# Altium footprint library Mi Libreria.PcbLib: 184 footprints (part 1 of 12)
Each footprint in its own frame and in the unit in brackets; x right, y up, seen from the top. Pads: shape width x height; smd on the part's side, far side on the other; paste and mask are expansions set on the pad; w line width, h text height; cw(c..) or ccw(c..) is an arc to the next point about the centre after c.
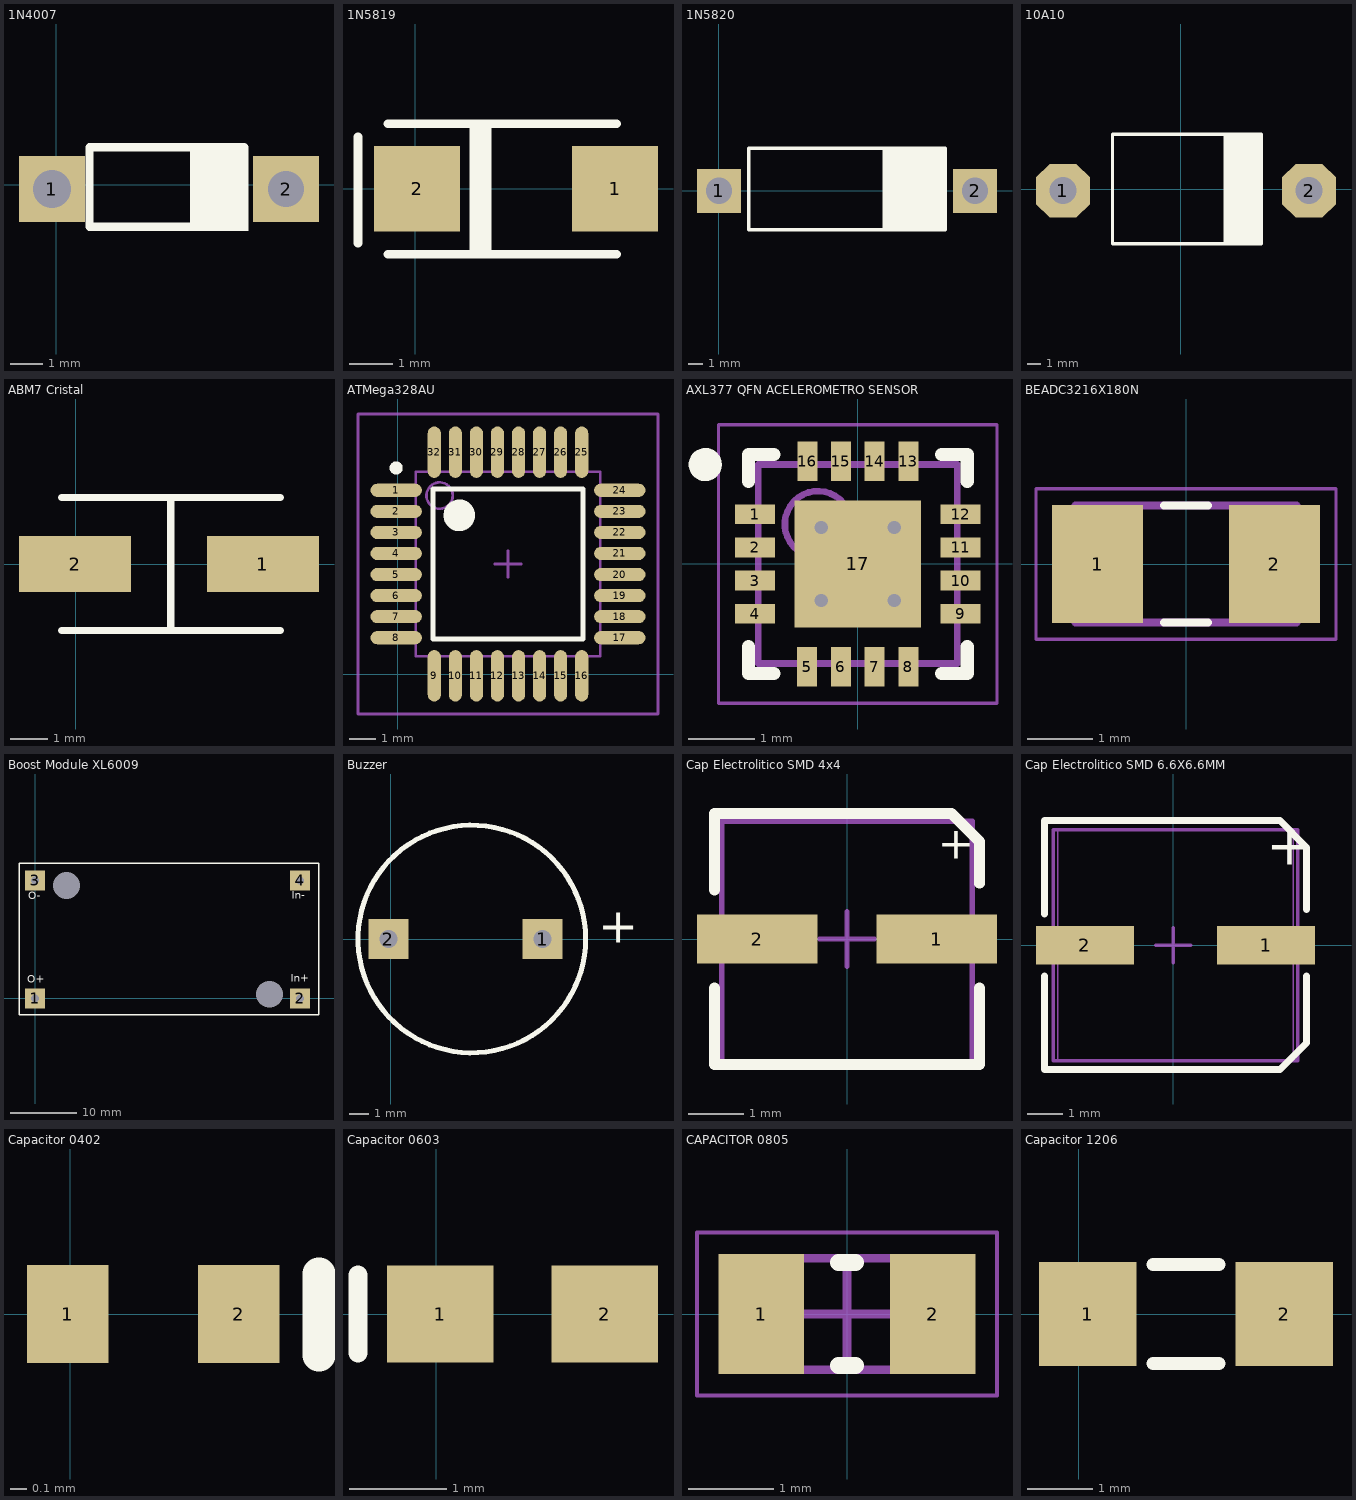
[diagram p0: the footprints below, top view; thin cyan lines are the x and y axes]

## 1N4007 [mm] "Diode Rectifier TH"
pads (2):
  rect 2x2 hole 1.15: 1(-0.127,-0.127)
  rect 2x2 hole 1.1: 2(6.985,-0.127)
Top Overlay:
  rectangle: 4.064,-1.397 5.842,1.143
  lines w0.254: 5.715,-1.27 1.016,-1.27 1.016,1.143 5.715,1.143
3D body "1N4007 x7mm.step": height 3.31, standoff -1.9, extent -0.471,-1.437 7.329,1.183

## 1N5819 [mm] "DO-214"
pads (2):
  rect 2x2 smd: 1(4.655,0) 2(0.044,0)
Top Overlay:
  region: 1.775,1.517 1.267,1.517 1.267,-1.531 1.775,-1.531
  lines w0.2: -1.333,-1.27 -1.333,1.206 ; -0.638,-1.531 4.696,-1.531 ; -0.638,1.517 4.696,1.517
3D body "User Library-DO-214AC_SMA.STEP": height 2.15, standoff -0.05, extent -0.238,-1.35 4.762,1.35

## 1N5820 [mm] "Diodo Shottky 3A Trough Hole"
pads (2):
  rect 3x3 hole 1.8: 1(0,0) 2(17.526,0)
Top Overlay:
  rectangle: 11.176,-2.667 15.494,2.921
  lines w0.254: 15.494,-1.524 15.494,2.921 2.032,2.921 2.032,-2.667 15.494,-2.667 15.494,1.651
3D body "1N5820.step": height 5.51, standoff -3.1, extent -0.727,-2.413 18.253,2.607

## 10A10 [mm] "DIODE"
pads (2):
  oct 4x4 hole 2: 1(-8.763,-0.127) 2(9.525,-0.127)
Top Overlay:
  rectangle: 3.175,-4.064 5.969,4.064
  lines w0.254: 5.969,-1.651 5.969,4.064 -5.08,4.064 -5.08,-4.064 5.969,-4.064 5.969,1.524
3D body "10A10.step": height 9.1, standoff -2, extent -9.54,-4.4 10.64,4.4

## ABM7 Cristal [mm]
pads (2):
  rect 3x1.5 smd: 1(5,0) 2(-0.02,0)
Top Overlay:
  lines w0.2: -0.381,-1.778 5.461,-1.778 ; -0.381,1.778 5.461,1.778 ; 2.54,-1.778 2.54,1.778
3D body "ABM7.step": height 1.44, standoff 0, extent -0.51,-1.75 5.59,1.75

## ATMega328AU [mm] "TQFP 32"
pads (32):
  oval 1.95x0.5 smd: 1(-0.059,6.991) 2(-0.059,6.191) 3(-0.059,5.391) 4(-0.059,4.591) 5(-0.059,3.791) 6(-0.059,2.991) 7(-0.059,2.191) 8(-0.059,1.391) 17(8.441,1.391) 18(8.441,2.191) 19(8.441,2.991) 20(8.441,3.791) 21(8.441,4.591) 22(8.441,5.391) 23(8.441,6.191) 24(8.441,6.991)
  oval 0.5x1.95 smd: 9(1.391,-0.059) 10(2.191,-0.059) 11(2.991,-0.059) 12(3.791,-0.059) 13(4.591,-0.059) 14(5.391,-0.059) 15(6.191,-0.059) 16(6.991,-0.059) 25(6.991,8.441) 26(6.191,8.441) 27(5.391,8.441) 28(4.591,8.441) 29(3.791,8.441) 30(2.991,8.441) 31(2.191,8.441) 32(1.391,8.441)
Top Overlay:
  circle w0.25: c-0.059,7.841 r0.125
  circle w0.6: c2.341,6.041 r0.3
  lines w0.2: 1.341,1.341 1.341,7.041 7.041,7.041 7.041,1.341 1.341,1.341
Mechanical 13:
  circle w0.1: c1.591,6.791 r0.5
  lines w0.1: 0.691,0.691 0.691,7.691 7.691,7.691 7.691,0.691 0.691,0.691
Mechanical 15:
  lines w0.1: 3.691,4.191 4.691,4.191 ; 4.191,3.691 4.191,4.691 ; -1.509,-1.509 -1.509,9.891 9.891,9.891 9.891,-1.509 -1.509,-1.509
3D body "atmega8.step": height 1.1, standoff -0.01, extent -0.552,-0.666 9.048,8.934

## AXL377 QFN ACELEROMETRO SENSOR [mm] "QFN, 16-Leads, Body 3.00x3.00mm, Pitch 0.50mm/0.51mm, Thermal Pad 1.91x1.91mm, IPC Medium Density"
height 1
pads (17):
  rect 0.6x0.3 smd: 1(-1.55,0.75) 2(-1.55,0.25) 3(-1.55,-0.25) 4(-1.55,-0.75) 9(1.55,-0.75) 10(1.55,-0.25) 11(1.55,0.25) 12(1.55,0.75)
  rect 0.3x0.6 smd: 5(-0.765,-1.55) 6(-0.255,-1.55) 7(0.255,-1.55) 8(0.765,-1.55) 13(0.765,1.55) 14(0.255,1.55) 15(-0.255,1.55) 16(-0.76,1.55)
  rect 1.91x1.91 smd: 17(0,0)
via -0.55,0.55 diameter 0.5 hole 0.2
via 0.55,0.55 diameter 0.5 hole 0.2
via -0.55,-0.55 diameter 0.5 hole 0.2
via 0.55,-0.55 diameter 0.5 hole 0.2
Top Overlay:
  circle w0.25: c-2.3,1.5 r0.125
  lines w0.2: -1.65,-1.25 -1.65,-1.65 -1.265,-1.65 ; -1.65,1.25 -1.65,1.65 -1.265,1.65 ; 1.265,-1.65 1.65,-1.65 1.65,-1.25 ; 1.265,1.65 1.65,1.65 1.65,1.25
Mechanical 13:
  circle w0.1: c-0.6,0.6 r0.5
  lines w0.1: -1.5,-1.5 -1.5,1.5 1.5,1.5 1.5,-1.5 -1.5,-1.5
Mechanical 15:
  lines w0.05: -2.1,-2.1 -2.1,2.1 2.1,2.1 2.1,-2.1 -2.1,-2.1
  lines w0.1: -0.5,0 0.5,0 ; 0,-0.5 0,0.5
3D body: height 1, standoff 0.01, extent -1.5,-1.5 1.5,1.5

## BEADC3216X180N [mm]
pads (2):
  rect 1.4x1.82 smd: 1(-1.36,0) 2(1.36,0)
Top Overlay:
  lines w0.127: -0.34,-0.9 0.34,-0.9 ; -0.34,0.9 0.34,0.9
Mechanical 13:
  lines w0.127: -1.7,-0.9 1.7,-0.9 1.7,0.9 -1.7,0.9 -1.7,-0.9
Mechanical 15:
  lines w0.05: -2.308,-1.158 2.308,-1.158 2.308,1.158 -2.308,1.158 -2.308,-1.158
3D body "BLM31KN102BH1L.STEP": height 1.6, standoff 0, extent -1.6,-0.911 1.6,0.889

## Boost Module XL6009 [mm] "Boost Converter DC-DC"
pads (6):
  rect 3x3 hole 1.2: 1(0,0) 2(39.6,0) 3(0,17.653) 4(39.6,17.653)
  round 1.524 hole 4: ""(4.699,16.891) ""(35.032,0.635)
Top Overlay:
  lines w0.2: -2.413,-2.413 42.418,-2.413 42.418,20.193 -2.413,20.193 -2.413,-2.413
  text "O+" at -1.143,1.905 h2
  text "O-" at -1.016,14.351 h2
  text "In-" at 38.354,14.478 h2
  text "In+" at 38.227,2.032 h2
3D body "DC-DC XL6009E1 (STEP AP214).STEP": height 14.05, standoff 0.3, extent -1.651,-1.651 41.649,19.449

## Buzzer [mm] "Buzzer 5V"
pads (2):
  rect 2x2 hole 0.9: 1(7.62,0) 2(-0.127,0)
Top Overlay:
  circle w0.254: c4.064,0 r5.715
  text "+" at 10.414,-0.762 h3
3D body "Buzzer.step": height 10.65, standoff -3.5, extent -2.266,-6.096 13.188,5.904

## Cap Electrolitico SMD 4x4 [mm] "SMD Capacitor 4x4mm"
pads (2):
  rect 2.2x0.9 smd: 1(1.634,0) 2(-1.634,0)
Top Overlay:
  lines w0.2: -2.413,-0.889 -2.413,-2.286 2.413,-2.286 2.413,-0.889 ; -2.413,0.889 -2.413,2.286 1.905,2.286 2.413,1.778 2.413,1.016
  text "+" at 1.651,1.27 h1
Mechanical 13:
  lines w0.1: -2.286,-2.286 2.286,-2.286 2.286,2.15 -2.286,2.15 -2.286,-2.286
Mechanical 15:
  lines w0.05: -2.286,-2.286 2.286,-2.286 2.286,2.159 -2.286,2.159 -2.286,-2.286
  lines w0.1: -0.5,0 0.5,0 ; 0,-0.5 0,0.5
3D body "Elect SMD 4x4.STEP": height 3.91, standoff 0, extent -2.286,-2.15 2.314,2.15

## Cap Electrolitico SMD 6.6X6.6MM [mm] "SMD Capacitor 6.6X6.6mm"
pads (2):
  rect 2.8x1.1 smd: 1(2.65,0) 2(-2.523,0)
Top Overlay:
  lines w0.2: -3.683,-0.889 -3.683,-3.556 3.048,-3.556 3.81,-2.794 3.81,-0.889 ; -3.683,0.889 -3.683,3.556 3.048,3.556 3.81,2.794 3.81,1.016
  text "+" at 2.65,1.905 h2
Mechanical 13:
  lines w0.1: -3.429,-3.302 -3.429,3.302 3.556,3.302 3.556,-3.302 -3.429,-3.302
Mechanical 15:
  lines w0.05: -3.302,-3.302 -3.302,3.302 3.429,3.302 3.429,-3.302 -3.302,-3.302
  lines w0.1: -0.5,0 0.5,0 ; 0,-0.5 0,0.5
3D body "CAP6.6X6.6.STEP": height 3.91, standoff 0, extent -3.441,-3.3 3.559,3.3

## Capacitor 0402 [mm] "Capacitor 0402"
pads (2):
  rect 0.5x0.6 smd: 1(-0.015,0) 2(1.031,0)
Top Overlay:
  lines w0.2: 1.524,-0.254 1.524,0.246
3D body "0402C.step": height 0.36, standoff 0, extent 0.008,-0.265 1.008,0.265

## Capacitor 0603 [mm] "Chip Capacitor 0603 SMD"
pads (2):
  rect 1.1x1 smd: 1(0.039,0) 2(1.739,0)
Top Overlay:
  lines w0.2: -0.811,-0.4 -0.811,0.4
3D body "0603C.step": height 0.9, standoff 0, extent 0.089,-0.4 1.689,0.4

## CAPACITOR 0805 [mm] "SMD CAPACITOR"
height 0.75
pads (2):
  rect 1x1.4 smd: 1(-1,0) 2(1,0)
Top Overlay:
  lines w0.2: -0.1,-0.6 0.1,-0.6 ; -0.1,0.6 0.1,0.6
Mechanical 13:
  lines w0.1: -1.05,-0.65 1.05,-0.65 1.05,0.65 -1.05,0.65 -1.05,-0.65
Mechanical 15:
  lines w0.05: -1.75,-0.95 1.75,-0.95 1.75,0.95 -1.75,0.95 -1.75,-0.95
  lines w0.1: -0.5,0 0.5,0 ; 0,-0.5 0,0.5
3D body: height 1, standoff 0, extent 0.52,-0.65 1.05,0.65
3D body: height 1, standoff 0, extent -1.05,-0.65 -0.52,0.65
3D body: height 1, standoff 0, extent -0.52,-0.65 0.52,0.65

## Capacitor 1206 [mm] "Capacitor Ceramico 1206"
pads (2):
  rect 1.5x1.6 smd: 1(0.139,0) 2(3.163,0)
Top Overlay:
  lines w0.2: 1.143,-0.762 2.159,-0.762 ; 1.143,0.762 2.159,0.762
3D body "1206 SMD Capacitor.step": height 1, standoff 0, extent 0.051,-0.8 3.251,0.8